# Altium footprint library Amirreza.PcbLib: 524 footprints (part 13 of 33)
Each footprint in its own frame and in the unit in brackets; x right, y up, seen from the top. Pads: shape width x height; smd on the part's side, far side on the other; paste and mask are expansions set on the pad; w line width, h text height; cw(c..) or ccw(c..) is an arc to the next point about the centre after c.
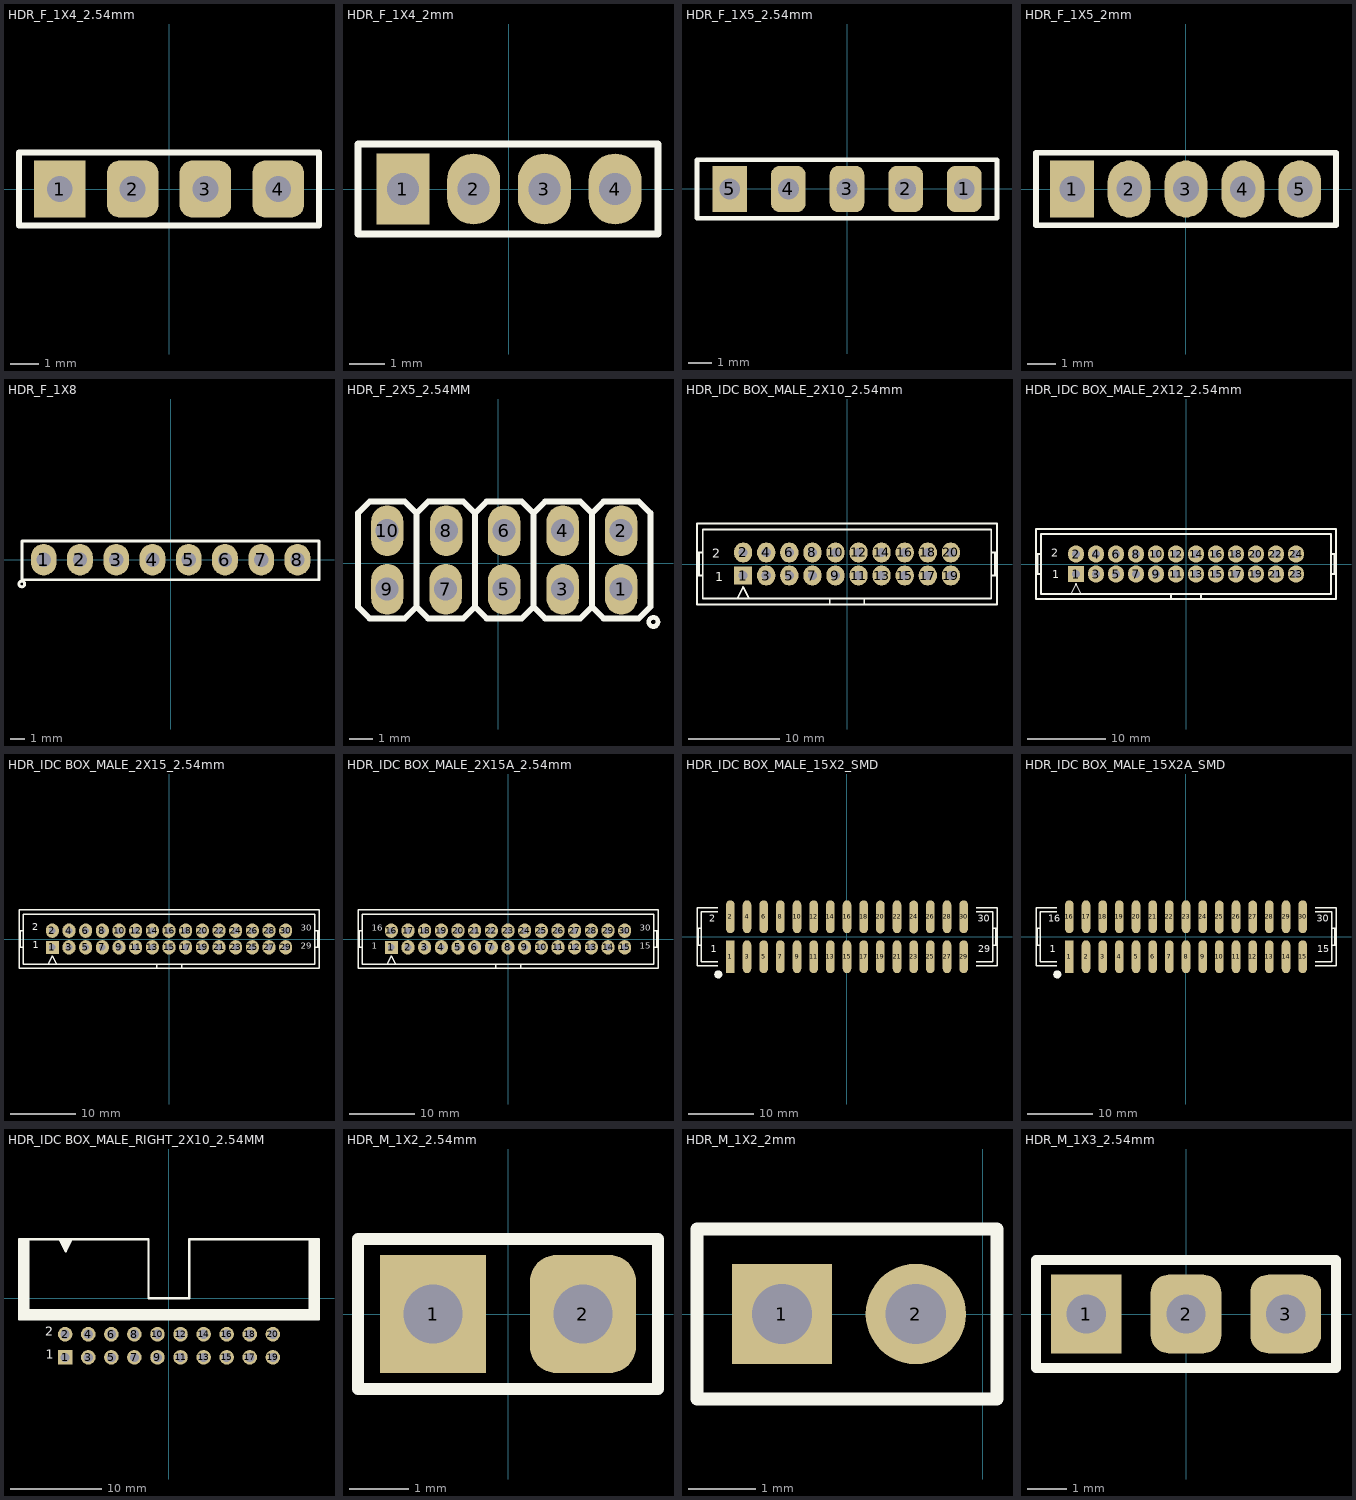
[diagram p12: the footprints below, top view; thin cyan lines are the x and y axes]

## HDR_F_1X4_2.54mm [mm]
pads (4):
  rect 1.8x2 hole 0.9: 1(-3.81,0)
  rrect50% 1.8x2 hole 0.9: 2(-1.27,0) 3(1.27,0) 4(3.81,0)
Top Overlay:
  lines w0.2: -5.234,-1.27 -5.234,1.27 5.232,1.27 5.232,-1.27 -5.234,-1.27
3D body "User Library-zl262-4s_p2-54_l10-66_w2-54_h8-5.step": height 8.55, standoff -2.95, extent -5.33,-1.27 5.33,1.27

## HDR_F_1X4_2mm [mm]
pads (4):
  rect 1.5x2 hole 0.9: 1(-3,0)
  oval 1.5x2 hole 0.9: 2(-1,0) 3(1,0) 4(3,0)
Top Overlay:
  lines w0.2: -4.27,-1.27 -4.27,1.27 4.214,1.27 4.214,-1.27 -4.27,-1.27
3D body "User Library-PBS2-4.STEP": height 4.36, standoff -3.09, extent -4,-1.009 4,0.991

## HDR_F_1X5_2.54mm [mm]
pads (5):
  rrect50% 1.5x2 hole 0.9: 1(5.08,0) 2(2.54,0) 3(0,0) 4(-2.54,0)
  rect 1.5x2 hole 0.9: 5(-5.08,0)
Top Overlay:
  lines w0.2: -6.5,-1.27 -6.5,1.27 6.5,1.27 6.5,-1.27 -6.5,-1.27
3D body "User Library-DS1023-1x5S21.step": height 8.53, standoff -2.97, extent -6.6,-1.27 6.6,1.27

## HDR_F_1X5_2mm [mm] "Connector; Header; 5 Position"
pads (5):
  rect 1.54x2 hole 0.9: 1(-4,0)
  oval 1.5x2 hole 0.9: 2(-2,0) 3(0,0) 4(2,0) 5(4,0)
Top Overlay:
  lines w0.2: -5.27,-1.27 5.271,-1.27 5.271,1.27 -5.27,1.27 -5.27,-1.27
3D body "User Library-PBS2-5.STEP": height 4.3, standoff -3.15, extent -5,-0.991 5,1.009

## HDR_F_1X8 [mm] "HEADER FEMALE pitch: 2.54mm"
pads (8):
  oval 1.8x2.2 hole 1 mask+0.1: 1(-8.89,0) 2(-6.35,0) 3(-3.81,0) 4(-1.27,0) 5(1.27,0) 6(3.81,0) 7(6.35,0) 8(8.89,0)
Top Overlay:
  circle w0.2: c-10.42,-1.7 r0.2
  lines w0.2: -10.4,-1.4 -10.4,1.3 10.4,1.3 10.4,-1.4 -10.4,-1.4
3D body "female_header_a-bl254-eg-g02d.stp": height 8.5, standoff -3.2, extent 4.955,-1.3 10.285,1.2
3D body "female_header_a-bl254-eg-g03d.stp": height 8.5, standoff -3.2, extent -10.285,-1.3 -2.415,1.2
3D body "female_header_a-bl254-eg-g03d.stp": height 8.5, standoff -3.2, extent -2.665,-1.3 5.205,1.2

## HDR_F_2X5_2.54MM [mm]
pads (10):
  oval 1.4x2.2 hole 1: 1(5.332,-1.118) 2(5.332,1.422) 3(2.792,-1.118) 4(2.792,1.422) 5(0.252,-1.118) 6(0.252,1.422) 7(-2.288,-1.118) 8(-2.262,1.422) 9(-4.828,-1.118) 10(-4.828,1.422)
Top Overlay:
  circle w0.2: c6.731,-2.54 r0.2
  lines w0.254: -3.557,-1.88 -3.051,-2.386 -1.526,-2.386 -1.017,-1.878 -1.017,2.186 -0.51,2.694 1.013,2.694 1.523,2.184 ; -3.557,2.184 -4.067,2.694 -5.59,2.694 -6.097,2.186 -6.097,-1.88 -5.591,-2.386 -4.066,-2.386 -3.557,-1.878 -3.557,2.186 -3.05,2.694 -1.527,2.694 -1.017,2.184 ; -1.017,-1.88 -0.511,-2.386 1.014,-2.386 1.523,-1.878 1.523,2.186 2.03,2.694 3.553,2.694 4.063,2.184 ; 1.523,-1.88 2.029,-2.386 3.554,-2.386 4.063,-1.878 4.063,2.186 4.57,2.694 6.093,2.694 6.603,2.184 ; 4.063,-1.88 4.569,-2.386 6.094,-2.386 6.603,-1.878 6.603,2.186
3D body "BG151-10-X-0320.STEP": height 5, standoff -3.2, extent -6.346,-1.207 6.854,11.633

## HDR_IDC BOX_MALE_2X10_2.54mm [mm]
pads (20):
  rect 2x2 hole 1 mask+0.1: 1(-11.43,-1.27)
  oval 2x2.2 hole 1 mask+0.1: 2(-11.43,1.27) 3(-8.89,-1.27) 4(-8.89,1.27) 5(-6.35,-1.27) 6(-6.35,1.27) 7(-3.81,-1.27) 8(-3.81,1.27) 9(-1.27,-1.27) 10(-1.27,1.27) 11(1.27,-1.27) 12(1.27,1.27) 13(3.81,-1.27) 14(3.81,1.27) 15(6.35,-1.27) 16(6.35,1.27) 17(8.89,-1.27) 18(8.89,1.27) 19(11.43,-1.27) 20(11.43,1.27)
Top Overlay:
  lines w0.2: -16.51,-1.27 -15.875,-1.27 ; -16.51,1.27 -15.875,1.27 ; -16.298,-1.27 -16.298,1.27 ; -12.065,-3.81 -11.43,-2.54 -10.795,-3.81 ; -1.905,-4.445 -1.905,-3.81 ; 1.905,-4.445 1.905,-3.81 ; 15.875,-1.27 16.51,-1.27 ; 15.875,1.27 16.51,1.27 ; 16.298,-1.27 16.298,1.27 ; -1.905,-3.81 1.905,-3.81 ; -1.905,-3.81 -15.875,-3.81 -15.875,3.81 15.875,3.81 15.875,-3.81 1.905,-3.81 ; -16.51,-4.445 16.51,-4.445 16.51,4.445 -16.51,4.445 -16.51,-4.445
  text "1" at -14.529,-1.905 h1
  text "2" at -14.859,0.686 h1
3D body "61202021621.stp": height 9.13, standoff -2.98, extent -16.53,-4.425 16.53,4.75

## HDR_IDC BOX_MALE_2X12_2.54mm [mm]
pads (24):
  rect 2x2 hole 1 mask+0.1: 1(-13.97,-1.27)
  oval 2x2.2 hole 1 mask+0.1: 2(-13.97,1.27) 3(-11.43,-1.27) 4(-11.43,1.27) 5(-8.89,-1.27) 6(-8.89,1.27) 7(-6.35,-1.27) 8(-6.35,1.27) 9(-3.81,-1.27) 10(-3.81,1.27) 11(-1.27,-1.27) 12(-1.27,1.27) 13(1.27,-1.27) 14(1.27,1.27) 15(3.81,-1.27) 16(3.81,1.27) 17(6.35,-1.27) 18(6.35,1.27) 19(8.89,-1.27) 20(8.89,1.27) 21(11.43,-1.27) 22(11.43,1.27) 23(13.97,-1.27) 24(13.97,1.27)
Top Overlay:
  lines w0.2: -19.05,-1.27 -18.415,-1.27 ; -19.05,1.27 -18.415,1.27 ; -18.838,-1.27 -18.838,1.27 ; -14.605,-3.81 -13.97,-2.54 -13.335,-3.81 ; -1.905,-4.445 -1.905,-3.81 ; 1.905,-4.445 1.905,-3.81 ; 18.415,-1.27 19.05,-1.27 ; 18.415,1.27 19.05,1.27 ; 18.838,-1.27 18.838,1.27 ; -1.905,-3.81 -18.415,-3.81 -18.415,3.81 18.415,3.81 18.415,-3.81 1.905,-3.81 ; -1.905,-3.81 1.905,-3.81 ; -19.05,-4.445 -19.05,4.445 19.05,4.445 19.05,-4.445 -19.05,-4.445
  text "2" at -17.12,0.914 h1
  text "1" at -16.967,-1.778 h1
3D body "61202421621.stp": height 9.13, standoff -2.98, extent -19.07,-4.425 19.07,4.75

## HDR_IDC BOX_MALE_2X15_2.54mm [mm]
pads (30):
  rect 2x2 hole 1 mask+0.1: 1(-17.78,-1.27)
  oval 2x2.2 hole 1 mask+0.1: 2(-17.78,1.27) 3(-15.24,-1.27) 4(-15.24,1.27) 5(-12.7,-1.27) 6(-12.7,1.27) 7(-10.16,-1.27) 8(-10.16,1.27) 9(-7.62,-1.27) 10(-7.62,1.27) 11(-5.08,-1.27) 12(-5.08,1.27) 13(-2.54,-1.27) 14(-2.54,1.27) 15(0,-1.27) 16(0,1.27) 17(2.54,-1.27) 18(2.54,1.27) 19(5.08,-1.27) 20(5.08,1.27) 21(7.62,-1.27) 22(7.62,1.27) 23(10.16,-1.27) 24(10.16,1.27) 25(12.7,-1.27) 26(12.7,1.27) 27(15.24,-1.27) 28(15.24,1.27) 29(17.78,-1.27) 30(17.78,1.27)
Top Overlay:
  lines w0.2: -22.86,-1.27 -22.225,-1.27 ; -22.86,1.27 -22.225,1.27 ; -22.648,-1.27 -22.648,1.27 ; -18.415,-3.81 -17.78,-2.54 -17.145,-3.81 ; -1.905,-4.445 -1.905,-3.81 ; 1.905,-4.445 1.905,-3.81 ; 22.225,-1.27 22.86,-1.27 ; 22.225,1.27 22.86,1.27 ; 22.648,-1.27 22.648,1.27 ; -1.905,-3.81 1.905,-3.81 ; -1.905,-3.81 -22.225,-3.81 -22.225,3.81 22.225,3.81 22.225,-3.81 1.905,-3.81 ; -22.86,-4.445 22.86,-4.445 22.86,4.445 -22.86,4.445 -22.86,-4.445
  text "2" at -20.804,0.94 h1.78
  text "1" at -20.752,-1.753 h1.78
  text "29" at 20.081,-1.753 h1.57
  text "30" at 20.091,0.954 h1.57
3D body "User Library-IDC Socket Male 30pin Straight THT Goldplated 2_54mm.step": height 9.33, standoff -3.07, extent -22.8,-4.425 22.9,4.425

## HDR_IDC BOX_MALE_2X15A_2.54mm [mm]
pads (30):
  rect 2x2 hole 1 mask+0.1: 1(-17.78,-1.27)
  oval 2x2.2 hole 1 mask+0.1: 2(-15.24,-1.27) 3(-12.7,-1.27) 4(-10.16,-1.27) 5(-7.62,-1.27) 6(-5.08,-1.27) 7(-2.54,-1.27) 8(0,-1.27) 9(2.54,-1.27) 10(5.08,-1.27) 11(7.62,-1.27) 12(10.16,-1.27) 13(12.7,-1.27) 14(15.24,-1.27) 15(17.78,-1.27) 16(-17.78,1.27) 17(-15.24,1.27) 18(-12.7,1.27) 19(-10.16,1.27) 20(-7.62,1.27) 21(-5.08,1.27) 22(-2.54,1.27) 23(0,1.27) 24(2.54,1.27) 25(5.08,1.27) 26(7.62,1.27) 27(10.16,1.27) 28(12.7,1.27) 29(15.24,1.27) 30(17.78,1.27)
Top Overlay:
  lines w0.2: -22.86,-1.27 -22.225,-1.27 ; -22.86,1.27 -22.225,1.27 ; -22.648,-1.27 -22.648,1.27 ; -18.415,-3.81 -17.78,-2.54 -17.145,-3.81 ; -1.905,-4.445 -1.905,-3.81 ; 1.905,-4.445 1.905,-3.81 ; 22.225,-1.27 22.86,-1.27 ; 22.225,1.27 22.86,1.27 ; 22.648,-1.27 22.648,1.27 ; -1.905,-3.81 1.905,-3.81 ; -1.905,-3.81 -22.225,-3.81 -22.225,3.81 22.225,3.81 22.225,-3.81 1.905,-3.81 ; -22.86,-4.445 22.86,-4.445 22.86,4.445 -22.86,4.445 -22.86,-4.445
  text "30" at 20.091,0.954 h1.57
  text "15" at 20.081,-1.753 h1.57
  text "16" at -20.777,0.94 h1.57
  text "1" at -20.752,-1.767 h1.57
3D body "User Library-IDC Socket Male 30pin Straight THT Goldplated 2_54mm.step": height 9.33, standoff -3.07, extent -22.8,-4.425 22.9,4.425

## HDR_IDC BOX_MALE_15X2_SMD [mm]
pads (30):
  rect 1.3x5 / inner round 0 / far side round 0 all layers, no hole: 1(-17.78,-3.048)
  oval 1.3x5 / inner round 0 / far side round 0 all layers, no hole: 2(-17.78,3.048) 3(-15.24,-3.048) 4(-15.24,3.048) 5(-12.7,-3.048) 6(-12.7,3.048) 7(-10.16,-3.048) 8(-10.16,3.048) 9(-7.62,-3.048) 10(-7.62,3.048) 11(-5.08,-3.048) 12(-5.08,3.048) 13(-2.54,-3.048) 14(-2.54,3.048) 15(0,-3.048) 16(0,3.048) 17(2.54,-3.048) 18(2.54,3.048) 19(5.08,-3.048) 20(5.08,3.008) 21(7.62,-3.048) 22(7.62,3.048) 23(10.16,-3.048) 24(10.16,3.008) 25(12.7,-3.048) 26(12.7,3.048) 27(15.24,-3.048) 28(15.24,3.048) 29(17.78,-3.048) 30(17.78,3.048)
Top Overlay:
  circle w0.254: c-19.612,-5.74 r0.501
  region: -19.756,-5.261 -19.747,-5.27 -19.378,-5.27 -19.111,-5.537 -19.111,-5.907 -19.429,-6.225 -19.834,-6.225 -20.09,-5.969 -20.09,-5.586 -20.088,-5.583
  lines w0.2: -22.86,-1.27 -22.225,-1.27 ; -22.86,1.27 -22.225,1.27 ; -22.648,-1.27 -22.648,1.27 ; -19.714,-4.445 -22.86,-4.445 -22.86,4.445 -19.714,4.445 ; -19.707,-3.81 -22.225,-3.81 -22.225,3.81 -19.707,3.81 ; 19.707,-3.81 22.225,-3.81 22.225,3.81 19.707,3.81 ; 19.714,-4.445 22.86,-4.445 22.86,4.445 19.714,4.445 ; 22.225,-1.27 22.86,-1.27 ; 22.225,1.27 22.86,1.27 ; 22.648,-1.27 22.648,1.27
  text "29" at 20.013,-2.718 h1.78
  text "30" at 19.939,1.905 h1.78
  text "1" at -20.752,-2.734 h1.78
  text "2" at -21.031,1.905 h1.78
3D body "User Library-BH_30_M.STEP": height 10.3, standoff -0.02, extent -22.86,-4.8 22.86,4.8

## HDR_IDC BOX_MALE_15X2A_SMD [mm]
pads (30):
  rect 1.3x5 / inner round 0 / far side round 0 all layers, no hole: 1(-17.78,-3.048)
  oval 1.3x5 / inner round 0 / far side round 0 all layers, no hole: 2(-15.24,-3.048) 3(-12.7,-3.048) 4(-10.16,-3.048) 5(-7.62,-3.048) 6(-5.08,-3.048) 7(-2.54,-3.048) 8(0,-3.048) 9(2.54,-3.048) 10(5.08,-3.048) 11(7.62,-3.048) 12(10.16,-3.048) 13(12.7,-3.048) 14(15.24,-3.048) 15(17.78,-3.048) 16(-17.78,3.048) 17(-15.24,3.048) 18(-12.7,3.048) 19(-10.16,3.048) 20(-7.62,3.048) 21(-5.08,3.048) 22(-2.54,3.048) 23(0,3.048) 24(2.54,3.048) 25(5.08,3.008) 26(7.62,3.048) 27(10.16,3.008) 28(12.7,3.048) 29(15.24,3.048) 30(17.78,3.048)
Top Overlay:
  circle w0.254: c-19.612,-5.74 r0.501
  region: -19.756,-5.261 -19.747,-5.27 -19.378,-5.27 -19.111,-5.537 -19.111,-5.907 -19.429,-6.225 -19.834,-6.225 -20.09,-5.969 -20.09,-5.586 -20.088,-5.583
  lines w0.2: -22.86,-1.27 -22.225,-1.27 ; -22.86,1.27 -22.225,1.27 ; -22.648,-1.27 -22.648,1.27 ; -19.714,-4.445 -22.86,-4.445 -22.86,4.445 -19.714,4.445 ; -19.707,-3.81 -22.225,-3.81 -22.225,3.81 -19.707,3.81 ; 19.707,-3.81 22.225,-3.81 22.225,3.81 19.707,3.81 ; 19.714,-4.445 22.86,-4.445 22.86,4.445 19.714,4.445 ; 22.225,-1.27 22.86,-1.27 ; 22.225,1.27 22.86,1.27 ; 22.648,-1.27 22.648,1.27
  text "16" at -21.031,1.905 h1.78
  text "1" at -20.752,-2.734 h1.78
  text "30" at 19.939,1.905 h1.78
  text "15" at 20.013,-2.718 h1.78
3D body "User Library-BH_30_M.STEP": height 10.3, standoff -0.02, extent -22.86,-4.8 22.86,4.8

## HDR_IDC BOX_MALE_RIGHT_2X10_2.54MM [mm]
pads (20):
  rect 1.6x1.6 / inner rect 1.6x1.6 / far side rect 2x2 hole 1 mask+0.1: 1(-11.42,-6.491)
  round 1.6 / inner round 1.6 / far side round 2 hole 1 mask+0.1: 2(-11.42,-3.951) 3(-8.88,-6.491) 4(-8.88,-3.951) 5(-6.34,-6.491) 6(-6.34,-3.951) 7(-3.8,-6.491) 8(-3.8,-3.951) 9(-1.26,-6.491) 10(-1.26,-3.951) 11(1.28,-6.491) 12(1.28,-3.951) 13(3.82,-6.491) 14(3.82,-3.951) 15(6.36,-6.491) 16(6.36,-3.951) 17(8.9,-6.491) 18(8.9,-3.951) 19(11.44,-6.491) 20(11.44,-3.951)
Top Overlay:
  rectangle: -16.5,-2.3 -15.35,6.5
  region: 16.5,6.5 15.35,6.5 15.35,-2.3 16.5,-2.3
  region: 16.501,-2.3 16.501,-1.15 -16.5,-1.15 -16.5,-2.3
  region: -11.369,5.193 -11.687,5.828 -12.004,6.463 -10.734,6.463
  lines w0.254: -12.004,6.463 -11.369,5.193 -10.734,6.463 ; 16.5,6.5 2.25,6.5 2.25,0 -2.25,0 -2.25,6.5 -16.5,6.5 -16.5,-2.3 16.5,-2.3 16.52,6.5
  text "1" at -13.554,-6.999 h1.7
  text "2" at -13.604,-4.459 h1.7
3D body "User Library-idc-20-l_asm.STEP": height 8.58, standoff -2.82, extent -16.348,-6.839 16.352,5.81

## HDR_M_1X2_2.54mm [mm]
pads (2):
  rect 1.8x2 hole 1: 1(-1.27,0)
  rrect50% 1.8x2 hole 1: 2(1.27,0)
Top Overlay:
  lines w0.2: -2.54,-1.27 -2.54,1.27 2.54,1.27 2.54,-1.27 -2.54,-1.27
3D body "CircuitWorks-HEADER 2_54 VERTICAL 2X.step": height 8.55, standoff -2.45, extent -2.54,-1.25 2.54,1.25

## HDR_M_1X2_2mm [mm]
pads (2):
  rect 1.5x1.5 / inner rect 1.5x1.5 / far side rect 1.5x2 hole 0.9: 1(-3,0)
  round 1.5 / inner round 1.5 / far side oval 1.5x2 hole 0.9: 2(-1,0)
Top Overlay:
  lines w0.2: -4.27,-1.27 0.214,-1.27 0.214,1.27 -4.27,1.27 -4.27,-1.27
3D body "User Library-2-pinasm_asm.STEP": height 5.93, standoff -2.77, extent -4.025,-1.016 -0.025,0.984

## HDR_M_1X3_2.54mm [mm]
pads (3):
  rect 1.8x2 hole 1: 1(-2.54,0)
  rrect50% 1.8x2 hole 1: 2(0,0) 3(2.54,0)
Top Overlay:
  lines w0.254: -3.821,-1.381 -3.821,1.381 ; -3.81,-1.381 3.81,-1.381 ; -3.81,1.381 3.81,1.381 ; 3.821,-1.381 3.821,1.381
3D body "User Library-Header_Male_3Pin.STEP": height 8.59, standoff -2.95, extent -3.81,-1.27 3.81,1.22